# Altium footprint library Horizont_11_12_2017.PcbLib: 257 footprints (part 13 of 17)
Each footprint in its own frame and in the unit in brackets; x right, y up, seen from the top. Pads: shape width x height; smd on the part's side, far side on the other; paste and mask are expansions set on the pad; w line width, h text height; cw(c..) or ccw(c..) is an arc to the next point about the centre after c.
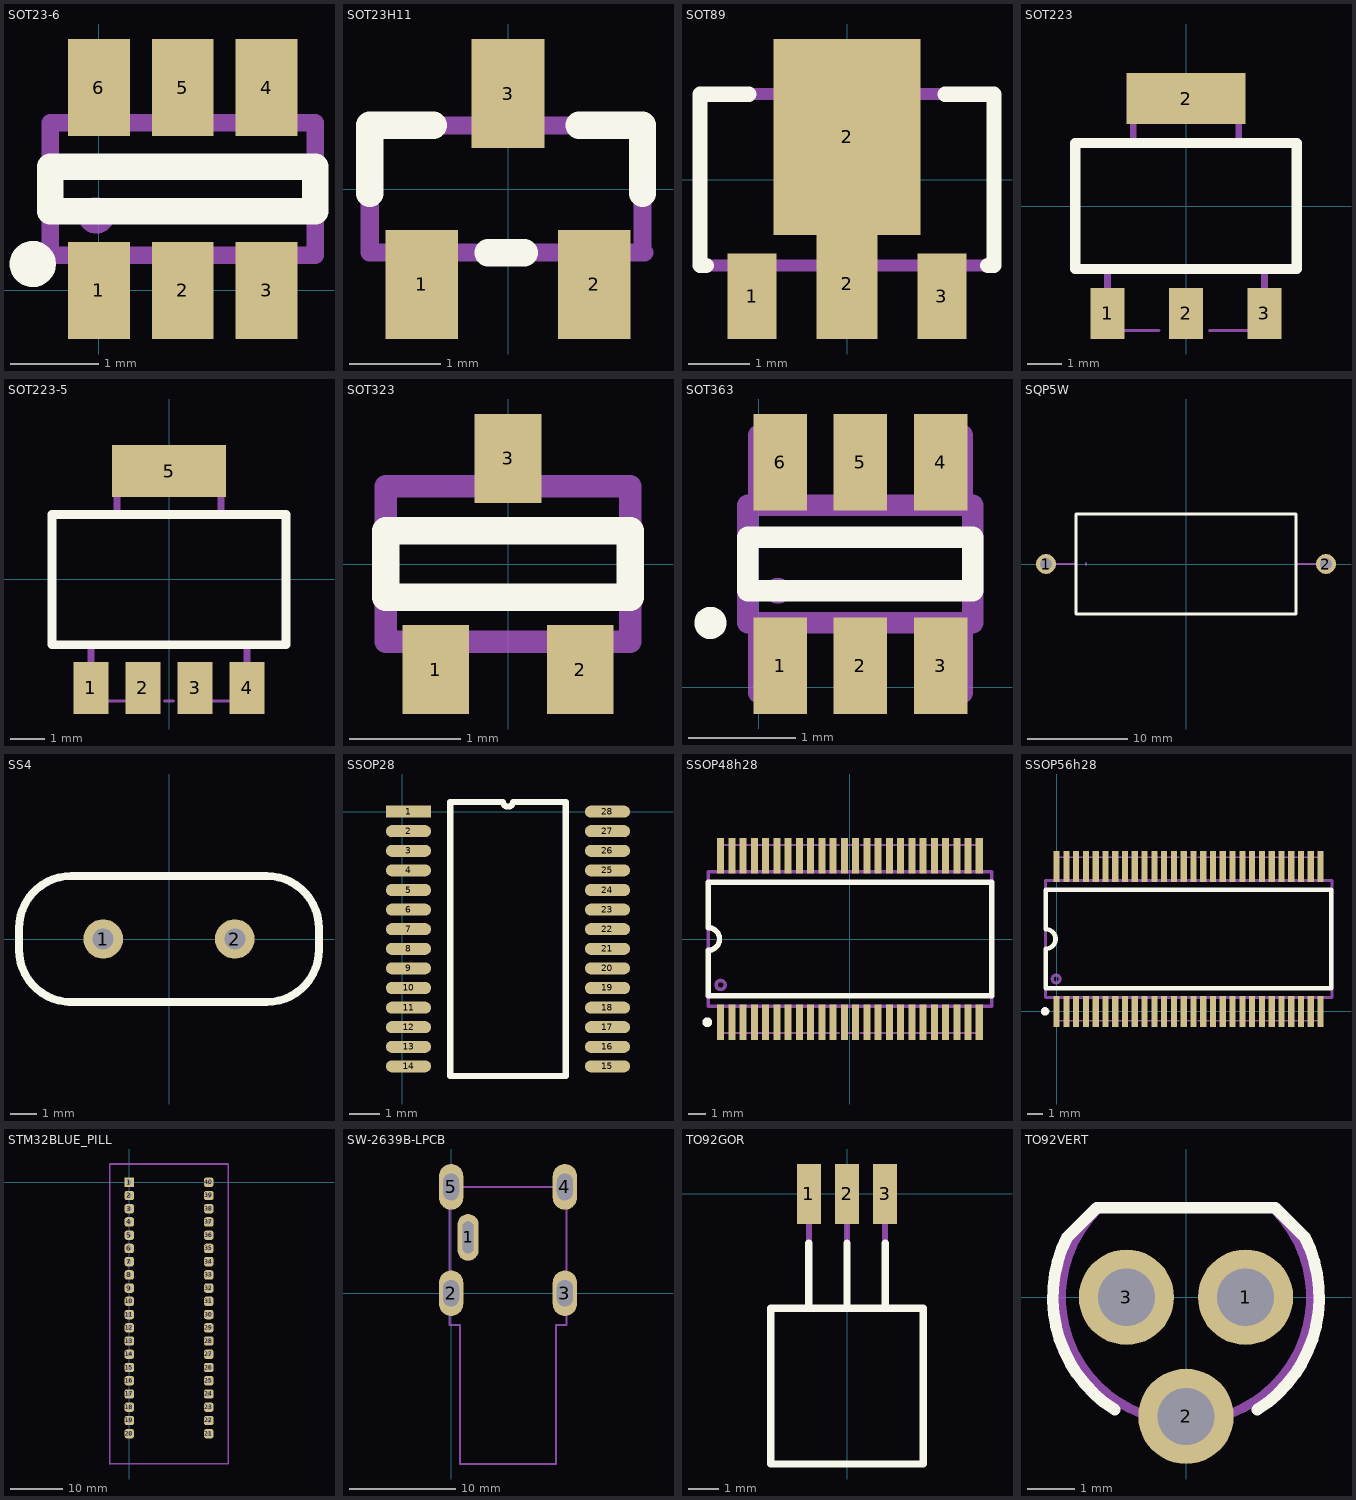
[diagram p12: the footprints below, top view; thin cyan lines are the x and y axes]

## SOT23-6 [mm]
height 1
pads (6):
  rect 0.7x1.1 smd: 1(0,0) 2(0.95,0) 3(1.9,0) 4(1.9,2.3) 5(0.95,2.3) 6(0,2.3)
Top Overlay:
  circle w0.3: c-0.75,0.3 r0.112
  lines w0.3: -0.55,0.9 -0.55,1.4 2.45,1.4 2.45,0.9 -0.55,0.9
Mechanical 1:
  circle w0.25: c-0.03,0.85 r0.08
  lines w0.2: 0,-0.25 0,0.4 ; 0,1.9 0,2.55 ; 0.95,1.9 0.95,2.55 ; 1.9,-0.25 1.9,0.4 ; 1.9,1.9 1.9,2.55 ; -0.55,0.4 2.45,0.4 2.45,1.9 -0.55,1.9 -0.55,0.4 ; 0.95,-0.25 0.95,0.4 0.95,-0.25
  text "6" at -1.1,2.2 h1.5
  text ".Comment" at -1.82,-1.51 h1.5
  text ".Designator" at -0.24,2.87 h1.5
3D body "TSOP6h11.stp": height 1.11, standoff 0, extent -0.5,-0.25 2.4,2.55

## SOT23H11 [mm]
height 1.1
pads (3):
  rect 0.8x1.2 smd: 1(-0.95,-1.05) 2(0.95,-1.05) 3(0,1.05)
Top Overlay:
  lines w0.3: -1.52,-0.05 -1.52,0.7 -0.82,0.7 ; -0.22,-0.7 0.18,-0.7 ; 0.78,0.7 1.48,0.7 1.48,-0.05
Mechanical 1:
  lines w0.2: -0.97,-1.3 -0.97,-0.7 ; 0,0.7 0,1.3 ; 0.93,-1.3 0.93,-0.7 ; 1.48,-0.7 1.48,0.7 ; 1.5,-0.7 -1.52,-0.7 -1.52,0.7 1.5,0.7
  text ".Designator" at -1.66,1.85 h1.5
  text ".Comment" at -2.72,-2.58 h1.5
3D body "SOT23h11.stp": height 1.1, standoff 0, extent -1.5,-1.25 1.5,1.25

## SOT89 [mm]
height 1.6
pads (4):
  rect 0.8x1.4 smd: 1(-1.55,-1.9) 3(1.55,-1.9)
  rect 1x1.8 smd: 2(0,-1.7)
  rect 2.4x3.2 smd: 2(0,0.7)
Top Overlay:
  lines w0.25: -2.3,-1.4 -2.4,-1.4 -2.4,1.4 -1.6,1.4 ; 1.6,1.4 2.4,1.4 2.4,-1.4 2.3,-1.4
Top Solder:
  region: 2.4,-1.4 2.4,1.4 -2.4,1.4 -2.4,-1.4
Mechanical 1:
  lines w0.2: -1.55,-2.1 -1.55,-1.4 ; -0.9,1.4 -0.9,2.05 0.9,2.05 0.9,1.4 ; 0,-2.1 0,-1.4 ; 1.55,-2.1 1.55,-1.4 ; -2.4,-1.4 2.4,-1.4 2.4,1.4 -2.4,1.4 -2.4,-1.4
  text "1" at -1.9,-1 h1.5
  text "2" at -0.4,-0.1 h1.5
  text "3" at 1.2,-1 h1.5
  text ".Designator" at -1.98,-3.55 h1.5
3D body "SOT89.stp": height 1.7, standoff 0, extent -2.35,-2.45 2.35,1.85

## SOT223 [mm]
height 1.7
pads (4):
  rect 1x1.5 smd: 1(-2.3,-3.15) 2(0,-3.15) 3(2.3,-3.15)
  rect 3.5x1.5 smd: 2(0,3.15)
Top Overlay:
  lines w0.3: -3.25,-1.85 -3.25,1.85 3.25,1.85 3.25,-1.85 -3.25,-1.85
Mechanical 1:
  lines w0.1: -2.3,-3.65 -0.8,-3.65 ; -0.175,-3.65 0.075,-3.65 ; 0.7,-3.65 2.3,-3.65
  lines w0.2: -2.3,-3.65 -2.3,-1.9 ; -1.55,1.85 -1.55,3.65 1.55,3.65 1.55,1.85 ; 2.3,-3.65 2.3,-1.9 ; -3.25,-1.85 -3.25,1.85 3.25,1.85 3.25,-1.85 -3.25,-1.85
  text "2" at -0.2,0.55 h1.5
  text "3" at 2,-1.45 h1.5
  text "1" at -2.5,-1.4 h1.5
  text ".Comment" at -2.9,-5.15 h1.5
  text ".Designator" at -2.26,4.55 h1.5
3D body "SOT223.stp": height 1.7, standoff 0, extent -3.25,-3.65 3.25,3.65

## SOT223-5 [mm]
pads (5):
  rect 1x1.5 smd: 1(-2.25,-3.13) 2(-0.75,-3.13) 3(0.75,-3.13) 4(2.25,-3.13)
  rect 3.3x1.5 smd: 5(0,3.12)
Top Overlay:
  lines w0.25: -3.375,-1.88 -3.375,1.87 3.375,1.87 3.375,-1.88 -3.375,-1.88
Mechanical 1:
  lines w0.1: -2.25,-3.505 -0.75,-3.505 ; -0.125,-3.505 0.125,-3.505 ; 0.75,-3.505 2.25,-3.505
  lines w0.2: -2.25,-3.505 -2.25,-1.88 ; -1.5,1.87 -1.5,3.62 1.5,3.62 1.5,1.87 ; 2.25,-3.505 2.25,-1.88 ; -3.375,-1.88 -3.375,1.87 3.375,1.87 3.375,-1.88 -3.375,-1.88
  text "1" at -2,-3.255 h1.5
  text "4" at 1,-3.255 h1.5
  text "5" at -0.375,2.245 h1.5
  text ".Designator" at -1,0.5 h1.5
  text ".Comment" at -2.5,-1.5 h1.5
3D body "SOT223-5.stp": height 1.7, standoff 0, extent -3.25,-3.65 3.25,3.65

## SOT323 [mm]
height 1.1
pads (3):
  rect 0.6x0.8 smd: 1(-0.65,-0.95) 2(0.65,-0.95) 3(0,0.95)
Top Overlay:
  lines w0.25: -1.1,-0.3 -1.1,0.3 1.1,0.3 1.1,-0.3 -1.1,-0.3
Mechanical 1:
  lines w0.2: -0.65,-1.2 -0.65,-0.7 ; 0,0.7 0,1.2 ; 0.65,-1.2 0.65,-0.7 ; -1.1,-0.7 1.1,-0.7 1.1,0.7 -1.1,0.7 -1.1,-0.7
  text ".Comment" at -1.82,-2.58 h1.5
  text ".Designator" at -0.76,1.85 h1.5
3D body "SOT323h11.ipt.stp": height 1.08, standoff 0, extent -1.1,-1.1 1.1,1.1

## SOT363 [mm]
height 1
pads (6):
  rect 0.5x0.9 smd: 1(0.2,0.2) 2(0.95,0.2) 3(1.7,0.2) 4(1.7,2.1) 5(0.95,2.1) 6(0.2,2.1)
Top Overlay:
  circle w0.2: c-0.45,0.6 r0.05
  lines w0.2: -0.1,0.9 -0.1,1.4 2,1.4 2,0.9 -0.1,0.9
Mechanical 1:
  circle w0.2: c0.18,0.9 r0.02
  lines w0.2: 0,-0.05 0,0.6 ; 0,1.7 0,2.35 ; 0.95,1.7 0.95,2.35 ; 1.9,-0.05 1.9,0.6 ; 1.9,1.7 1.9,2.35 ; -0.1,0.6 2,0.6 2,1.7 -0.1,1.7 -0.1,0.6 ; 0.95,-0.05 0.95,0.6 0.95,-0.05
  text "6" at -1.1,2.2 h1.5
  text ".Comment" at -2.32,-1.71 h1.5
  text ".Designator" at -0.24,2.87 h1.5
3D body "SOT363.STEP": height 0.95, standoff 0, extent -0.05,0.125 1.95,2.225
3D body: height 1.05, standoff 0.85, extent 0.101,0.801 0.3,1

## SQP5W [mm]
height 10
pads (2):
  round 2 hole 1.2: 1(-14,0) 2(14,0)
Top Overlay:
  lines w0.3: -11,-5 -11,5 11,5 11,-5 -11,-5
Mechanical 1:
  circle w0.1: c-10,0 r0.1
  lines w0.2: -14,0 -11,0 ; 11,0 14,0 ; -11,-5 11,-5 11,5 -11,5 -11,-5
  text ".Designator" at -2.5,0 h1.5
3D body "SQP5W.STEP": height 9, standoff -3, extent -14.4,-5 14.4,5

## SS4 [mm]
height 4.6
pads (2):
  round 1.5 hole 0.8: 1(-2.5,0) 2(2.5,0)
Top Overlay:
  lines w0.3: -5.7,-0.5 -5.7,0.4 cw(c-3.7,0.4) -3.7,2.4 3.7,2.4 cw(c3.7,0.4) 5.7,0.4 5.7,-0.4 cw(c3.7,-0.4) 3.7,-2.4 -3.8,-2.4 ; -5.7,-0.4 ccw(c-3.7,-0.4) -3.7,-2.4
Mechanical 1:
  circle w0.1: c-2.6,0.05 r0.1
  lines w0.2: -5.7,-0.5 -5.7,0.4 cw(c-3.7,0.4) -3.7,2.4 3.7,2.4 cw(c3.7,0.4) 5.7,0.4 5.7,-0.4 cw(c3.7,-0.4) 3.7,-2.4 -3.8,-2.4 ; -5.7,-0.4 ccw(c-3.7,-0.4) -3.7,-2.4
  text ".Designator" at -1.488,-0.046 h1.5
3D body "ss4.stp": height 4.1, standoff -3.1, extent -5.675,-2.325 5.675,2.325

## SSOP28 [mm]
pads (28):
  rect 1.5x0.4 smd: 1(0.2,0)
  oval 1.5x0.4 smd: 2(0.2,-0.65) 3(0.2,-1.3) 4(0.2,-1.95) 5(0.2,-2.6) 6(0.2,-3.25) 7(0.2,-3.9) 8(0.2,-4.55) 9(0.2,-5.2) 10(0.2,-5.85) 11(0.2,-6.5) 12(0.2,-7.15) 13(0.2,-7.8) 14(0.2,-8.45) 15(6.8,-8.45) 16(6.8,-7.8) 17(6.8,-7.15) 18(6.8,-6.5) 19(6.8,-5.85) 20(6.8,-5.2) 21(6.8,-4.55) 22(6.8,-3.9) 23(6.8,-3.25) 24(6.8,-2.6) 25(6.8,-1.95) 26(6.8,-1.3) 27(6.8,-0.65) 28(6.8,0)
Top Overlay:
  lines w0.2: 1.585,-8.775 1.585,0.325 3.338,0.325 ccw(c3.5,0.325) 3.662,0.325 5.415,0.325 5.415,-8.775 1.585,-8.775
3D body "User Library-SSOP28_LTC1923.STEP": height 1.75, standoff 0, extent 0.406,-9.197 6.594,0.785

## SSOP48h28 [mm]
height 2.8
pads (48):
  rect 0.4x2 smd: 1(-7.302,-4.7) 2(-6.667,-4.7) 3(-6.032,-4.7) 4(-5.397,-4.7) 5(-4.763,-4.7) 6(-4.127,-4.7) 7(-3.492,-4.7) 8(-2.857,-4.7) 9(-2.222,-4.7) 10(-1.587,-4.7) 11(-0.953,-4.7) 12(-0.318,-4.7) 13(0.318,-4.7) 14(0.953,-4.7) 15(1.587,-4.7) 16(2.222,-4.7) 17(2.857,-4.7) 18(3.492,-4.7) 19(4.127,-4.7) 20(4.763,-4.7) 21(5.397,-4.7) 22(6.032,-4.7) 23(6.667,-4.7) 24(7.302,-4.7) 25(7.302,4.7) 26(6.667,4.7) 27(6.032,4.7) 28(5.397,4.7) 29(4.763,4.7) 30(4.127,4.7) 31(3.492,4.7) 32(2.857,4.7) 33(2.222,4.7) 34(1.587,4.7) 35(0.953,4.7) 36(0.318,4.7) 37(-0.318,4.7) 38(-0.953,4.7) 39(-1.587,4.7) 40(-2.222,4.7) 41(-2.857,4.7) 42(-3.492,4.7) 43(-4.127,4.7) 44(-4.763,4.7) 45(-5.397,4.7) 46(-6.032,4.7) 47(-6.667,4.7) 48(-7.302,4.7)
Top Overlay:
  circle w0.3: c-8.053,-4.7 r0.125
  lines w0.3: -8,-3.2 -8,-0.635 ccw(c-8,0) -8,0.635 -8,3.2 8,3.2 8,-3.2 -8,-3.2
Mechanical 1:
  circle w0.2: c-7.3,-2.595 r0.254
  lines w0.1: -7.3,-5.3 -0.6,-5.3 ; -7.3,5.3 -0.6,5.3 ; -0.1,-5.3 0.1,-5.3 ; -0.1,5.3 0.1,5.3 ; 0.6,-5.3 7.3,-5.3 ; 0.6,5.3 7.3,5.3
  lines w0.2: -7.3,-5.3 -7.3,-3.8 ; -7.3,3.8 -7.3,5.3 ; 7.3,-5.3 7.3,-3.8 ; 7.3,3.8 7.3,5.3 ; -8,-3.8 -8,3.8 8,3.8 8,-3.8 -8,-3.8
  text ".Designator" at -1.145,0.58 h1.5
  text ".Comment" at -2.735,-1.12 h1.5
  text "48" at -7.4,2.3 h1.5
3D body "SSOP48h28.stp": height 1.71, standoff 0, extent -7.997,-5.3 8.003,5.3

## SSOP56h28 [mm]
height 2.8
pads (56):
  rect 0.4x2 smd: 1(0,0) 2(0.635,0) 3(1.27,0) 4(1.905,0) 5(2.54,0) 6(3.175,0) 7(3.81,0) 8(4.445,0) 9(5.08,0) 10(5.715,0) 11(6.35,0) 12(6.985,0) 13(7.62,0) 14(8.255,0) 15(8.89,0) 16(9.525,0) 17(10.16,0) 18(10.795,0) 19(11.43,0) 20(12.065,0) 21(12.7,0) 22(13.335,0) 23(13.97,0) 24(14.605,0) 25(15.24,0) 26(15.875,0) 27(16.51,0) 28(17.145,0) 29(17.145,9.4) 30(16.51,9.4) 31(15.875,9.4) 32(15.24,9.4) 33(14.605,9.4) 34(13.97,9.4) 35(13.335,9.4) 36(12.7,9.4) 37(12.065,9.4) 38(11.43,9.4) 39(10.795,9.4) 40(10.16,9.4) 41(9.525,9.4) 42(8.89,9.4) 43(8.255,9.4) 44(7.62,9.4) 45(6.985,9.4) 46(6.35,9.4) 47(5.715,9.4) 48(5.08,9.4) 49(4.445,9.4) 50(3.81,9.4) 51(3.175,9.4) 52(2.54,9.4) 53(1.905,9.4) 54(1.27,9.4) 55(0.635,9.4) 56(0,9.4)
Top Overlay:
  circle w0.3: c-0.75,0 r0.125
  lines w0.3: -0.702,1.5 17.848,1.5 17.848,7.9 -0.702,7.9 -0.702,5.335 cw(c-0.702,4.7) -0.702,4.065 -0.702,1.5
Mechanical 1:
  circle w0.2: c-0.028,2.105 r0.254
  lines w0.1: -0.028,-0.6 7.973,-0.6 ; -0.028,10 7.973,10 ; 8.473,-0.6 8.672,-0.6 ; 8.473,10 8.672,10 ; 9.172,-0.6 17.173,-0.6 ; 9.172,10 17.173,10
  lines w0.2: -0.028,-0.6 -0.028,0.9 ; -0.028,8.5 -0.028,10 ; 17.173,-0.6 17.173,0.9 ; 17.173,8.5 17.173,10 ; -0.727,0.9 17.872,0.9 17.872,8.5 -0.727,8.5 -0.727,0.9
  text "56" at -0.128,7 h1.5
  text ".Comment" at 5.837,3.58 h1.5
  text ".Designator" at 7.427,5.28 h1.5
3D body "SSOP56h28.stp": height 1.71, standoff 0, extent -0.727,-0.6 17.873,10

## STM32BLUE_PILL [mm]
pads (40):
  rect 1.8x1.8 hole 0.9: 1(0,0)
  rrect50% 1.8x1.8 hole 0.9: 2(0,-2.54) 3(0,-5.08) 4(0,-7.62) 5(0,-10.16) 6(0,-12.7) 7(0,-15.24) 8(0,-17.78) 9(0,-20.32) 10(0,-22.86) 11(0,-25.4) 12(0,-27.94) 13(0,-30.48) 14(0,-33.02) 15(0,-35.56) 16(0,-38.1) 17(0,-40.64) 18(0,-43.18) 19(0,-45.72) 20(0,-48.26) 21(15.25,-48.26) 22(15.25,-45.72) 23(15.25,-43.18) 24(15.25,-40.64) 25(15.25,-38.1) 26(15.25,-35.56) 27(15.25,-33.02) 28(15.25,-30.48) 29(15.25,-27.94) 30(15.25,-25.4) 31(15.25,-22.86) 32(15.25,-20.32) 33(15.25,-17.78) 34(15.25,-15.24) 35(15.25,-12.7) 36(15.25,-10.16) 37(15.25,-7.62) 38(15.25,-5.08) 39(15.25,-2.54) 40(15.25,0)
Mechanical 1:
  lines w0.3: -3.76,-54.08 -3.75,3.5 19,3.5 19,-54 -3.76,-54.08
  text "20" at 1.5,-48.99 h2
  text "40" at 11.75,-0.75 h2
  text "21" at 11.75,-49 h2
  text "1" at -2.5,-0.5 h2
  text ".Designator" at 5.42,6 h2
  text ".Comment" at 5.42,4.12 h2
3D body "STM32F103C8T6_Blue_Pill v6.step": height 14.77, standoff -3.5, extent -3.76,-54.08 19.1,3.48

## SW-2639B-LPCB [mm]
height 15
pads (5):
  oval 2x4.4 hole 1 slot 3 at 90 deg: 1(1.6,5.25)
  oval 2.3x4.3 hole 1.5 slot 2.5 at 90 deg: 2(0,0) 3(10.7,0) 4(10.7,10) 5(0,10)
Mechanical 1:
  lines w0.2: -0.15,10 10.85,10 ; -0.15,10 -0.15,-3 0.85,-3 0.85,-16.05 9.85,-16.05 9.85,-3 10.85,-3 10.85,10 ; -0.15,10 -0.15,10 ; 10.85,10 10.85,10
  text "2" at 0.7,-1.2 h1.5
  text ".Designator" at 3.05,2.3 h1.5
  text "1" at 1.55,4.9 h1.5
  text "3" at 9.35,-1.15 h1.5
  text "4" at 9.3,8.1 h1.5
  text "5" at 0.7,7.95 h1.5
3D body "SW-2639B-LPCB.stp": height 15.3, standoff -3.5, extent -0.15,-16 10.85,11

## TO92GOR [mm]
height 5.2
pads (3):
  rect 0.8x2 smd: 1(-1.27,0) 2(0,0) 3(1.27,0)
Top Overlay:
  lines w0.25: -1.27,-3.81 -1.27,-1.651 ; 0,-3.81 0,-1.651 ; 1.27,-3.81 1.27,-1.651 ; -2.54,-9.017 -2.54,-8.763 -2.54,-3.81 2.54,-3.81 2.54,-9.017 -2.54,-9.017
Mechanical 1:
  lines w0.2: -1.27,-3.81 -1.27,0.381 ; 0,-3.81 0,0.381 ; 1.27,-3.81 1.27,0.381 ; -2.54,-9.017 -2.54,-3.81 2.54,-3.81 2.54,-9.017 -2.54,-9.017
  text "3" at 1.039,-5.186 h1.5
  text "2" at -0.381,-5.207 h1.5
  text "1" at -1.628,-5.186 h1.5
  text ".Comment" at -2.794,-10.287 h1.5
  text ".Designator" at -1.143,-7.366 h1.5
3D body "TO92GOR.stp": height 4.18, standoff 0, extent -2.58,-9.01 2.58,0.5

## TO92VERT [mil]
height 342.52
pads (3):
  round 80 hole 48: 1(50,0) 2(0,-100) 3(-50,0)
Top Overlay:
  lines w9.84: -100,50 -75,75 75,75 100,50 ; -99.97,50.06 ccw(c0,0) -59.74,-94.5 ; 59.74,-94.5 ccw(c0,0) 99.97,50.06
Mechanical 1:
  lines w7.87: -75,75 75,75 ; -74,74 ccw(c0,0) 74,74
  text ".Designator" at -49.61,95.28 h59.06
  text "3" at -78.65,-24.48 h83.33
  text "1" at 21.35,-24.48 h83.33
  text "2" at -28.65,-114.48 h83.33
3D body "TO92VERT.stp": height 342.52, standoff -118.11, extent -101.56,-109.82 101.56,62.99